# Altium footprint library 6-Connectors-1.PcbLib: 54 footprints (part 3 of 5)
Each footprint in its own frame and in the unit in brackets; x right, y up, seen from the top. Pads: shape width x height; smd on the part's side, far side on the other; paste and mask are expansions set on the pad; w line width, h text height; cw(c..) or ccw(c..) is an arc to the next point about the centre after c.
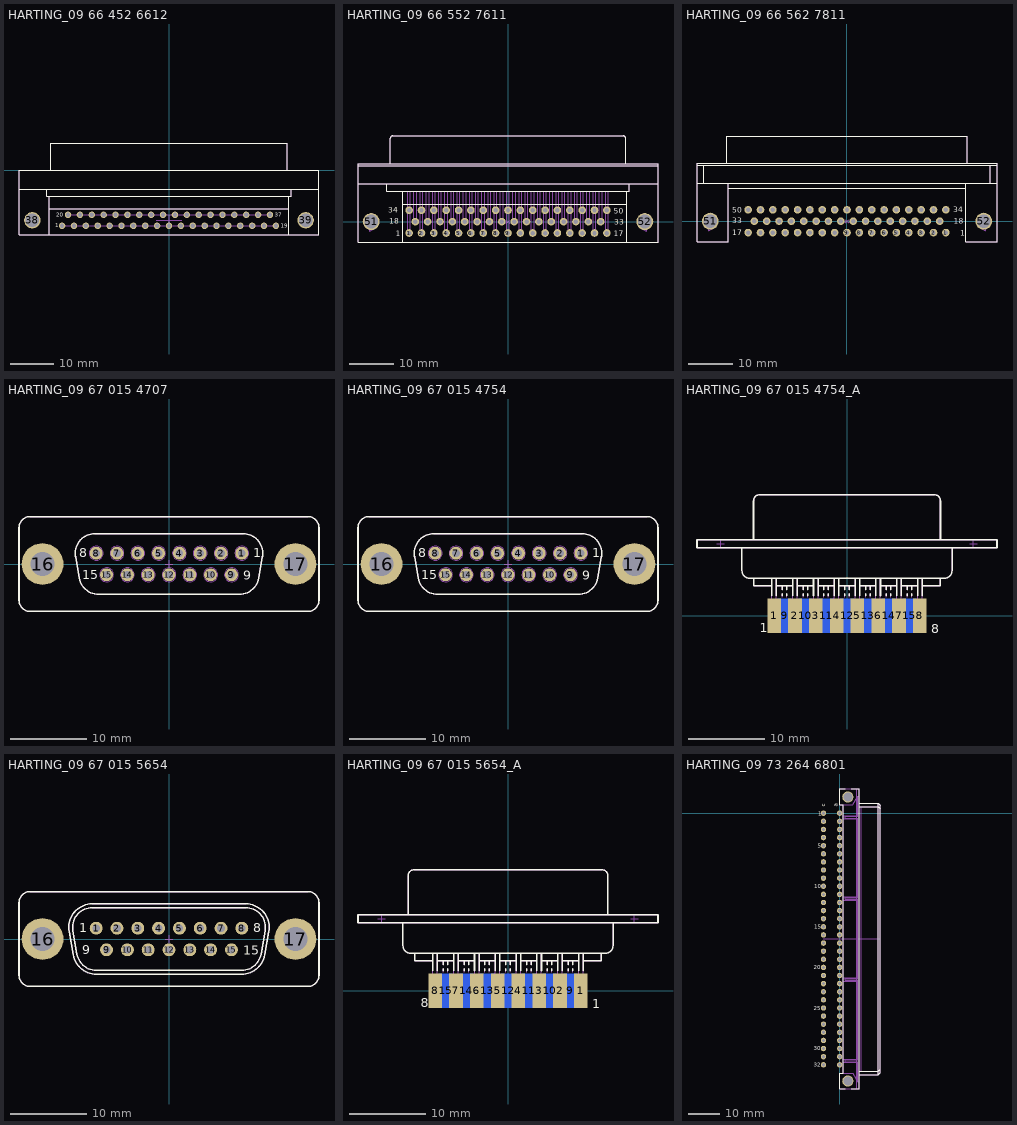
[diagram p2: the footprints below, top view; thin cyan lines are the x and y axes]

## HARTING_09 66 452 6612 [mm] "Right Angled, D-SUB 37 Female Contacts for PCB  With Grounding Board Lock And Female Screwlock UNC 4-40"
height 12.5
pads (39):
  round 1.5 hole 1: 1(-24.84,-12.94) 2(-22.08,-12.94) 3(-19.32,-12.94) 4(-16.56,-12.94) 5(-13.8,-12.94) 6(-11.04,-12.94) 7(-8.28,-12.94) 8(-5.52,-12.94) 9(-2.76,-12.94) 10(0,-12.94) 11(2.76,-12.94) 12(5.52,-12.94) 13(8.28,-12.94) 14(11.04,-12.94) 15(13.8,-12.94) 16(16.56,-12.94) 17(19.32,-12.94) 18(22.08,-12.94) 19(24.84,-12.94) 20(-23.46,-10.4) 21(-20.7,-10.4) 22(-17.94,-10.4) 23(-15.18,-10.4) 24(-12.42,-10.4) 25(-9.66,-10.4) 26(-6.9,-10.4) 27(-4.14,-10.4) 28(-1.38,-10.4) 29(1.38,-10.4) 30(4.14,-10.4) 31(6.9,-10.4) 32(9.66,-10.4) 33(12.42,-10.4) 34(15.18,-10.4) 35(17.94,-10.4) 36(20.7,-10.4) 37(23.46,-10.4)
  round 3.8 hole 3.2: 38(-31.75,-11.67) 39(31.75,-11.67)
Top Overlay:
  lines w0.2: -34.85,-4.5 34.85,-4.5 ; -28.4,-4.5 -28.4,-6.1 28.4,-6.1 28.4,-4.5 ; -27.85,-15 -27.85,-6.1 ; -27.85,-9 27.85,-9 ; -27.436,0 -27.436,6.2 27.436,6.2 27.436,0 ; 27.85,-15 27.85,-6.1 ; -34.85,-15 34.85,-15 ; -34.85,-15 -34.85,0 34.85,0 34.85,-15 ; -34.85,-15 34.85,-15
  text "37" at 24.582,-10.833 h0.97
  text "19" at 25.964,-13.373 h0.97
  text "1" at -26.416,-13.308 h0.97
  text "20" at -26.147,-10.833 h0.97
Mechanical 8:
  lines w0.05: -31.75,-11.7 -30.15,-11.7 ; -24.84,-12.94 24.84,-12.94 ; -23.46,-10.4 23.46,-10.4 ; -3.012,-11.67 0,-11.67 3.012,-11.67 ; 0,-12.94 0,-10.4 ; 31.75,-11.7 33.35,-11.7
Mechanical 14:
  lines w0.1: -34.85,-4.5 34.85,-4.5 ; -28.4,-4.5 -28.4,-6.1 28.4,-6.1 28.4,-4.5 ; -27.85,-15 -27.85,-6.1 ; -27.85,-9 27.85,-9 ; -27.436,0 -27.436,6.2 27.436,6.2 27.436,0 ; 27.85,-15 27.85,-6.1 ; -34.85,-15 34.85,-15 ; -34.85,-15 -34.85,0 34.85,0 34.85,-15 ; -34.85,-15 34.85,-15
  text "37" at 24.582,-10.833 h0.97
  text "19" at 25.964,-13.373 h0.97
  text "1" at -26.416,-13.308 h0.97
  text "20" at -26.147,-10.833 h0.97
3D body "HARTING_09 66 452 6612.stp": height 13.6, standoff -3.2, extent -34.85,-15 34.85,6.2

## HARTING_09 66 552 7611 [mm] "Right Angled D-Sub 50 Female Contacts With Grounding Board Locks And  M3 Nuts Thread"
height 16.4
pads (52):
  round 1.7 hole 1: 1(-22.08,-2.54) 2(-19.32,-2.54) 3(-16.56,-2.54) 4(-13.8,-2.54) 5(-11.04,-2.54) 6(-8.28,-2.54) 7(-5.52,-2.54) 8(-2.76,-2.54) 9(0,-2.54) 10(2.76,-2.54) 11(5.52,-2.54) 12(8.28,-2.54) 13(11.04,-2.54) 14(13.8,-2.54) 15(16.56,-2.54) 16(19.32,-2.54) 17(22.08,-2.54) 18(-20.7,0) 19(-17.94,0) 20(-15.18,0) 21(-12.42,0) 22(-9.66,0) 23(-6.9,0) 24(-4.14,0) 25(-1.38,0) 26(1.38,0) 27(4.14,0) 28(6.9,0) 29(9.66,0) 30(12.42,0) 31(15.18,0) 32(17.94,0) 33(20.7,0) 34(-22.08,2.54) 35(-19.32,2.54) 36(-16.56,2.54) 37(-13.8,2.54) 38(-11.04,2.54) 39(-8.28,2.54) 40(-5.52,2.54) 41(-2.76,2.54) 42(0,2.54) 43(2.76,2.54) 44(5.52,2.54) 45(8.28,2.54) 46(11.04,2.54) 47(13.8,2.54) 48(16.56,2.54) 49(19.32,2.54) 50(22.08,2.54)
  round 3.8 hole 3.1: 51(-30.55,0) 52(30.55,0)
Top Overlay:
  lines w0.2: -33.5,8.44 33.5,8.44 ; -33.5,12.44 33.5,12.44 ; -27.1,8.44 -27.1,6.84 27.1,6.84 27.134,8.44 ; -26.25,12.94 -26.25,18.64 cw(c-25.75,18.64) -25.75,19.14 25.75,19.14 cw(c25.75,18.64) 26.25,18.64 26.25,12.94 ; -23.5,-4.56 -23.5,6.84 ; -23.5,3.94 26.5,3.94 ; 26.5,-4.56 26.5,6.84 ; -33.5,-4.56 -33.5,12.94 33.5,12.94 33.5,-4.56 -33.5,-4.56
  text "17" at 23.656,-3.292 h1.2
  text "18" at -26.541,-0.517 h1.2
  text "34" at -26.694,1.993 h1.2
  text "1" at -25.089,-3.207 h1.2
  text "33" at 23.701,-0.652 h1.2
  text "50" at 23.656,1.788 h1.2
Mechanical 8:
  drawing of 212 lines, arcs and shapes, not listed
Mechanical 14:
  drawing of 165 lines, arcs and shapes, not listed
  text "1" at -25.089,-3.207 h1.2
  text "34" at -26.694,1.993 h1.2
  text "17" at 23.656,-3.292 h1.2
  text "18" at -26.541,-0.517 h1.2
  text "33" at 23.701,-0.652 h1.2
  text "50" at 23.656,1.788 h1.2
3D body "HARTING_09 66 552 7611.stp": height 16.4, standoff -3.2, extent -33.5,-4.56 33.5,19.14

## HARTING_09 66 562 7811 [mm] "Right Angled D-Sub 50 Male Contacts With Grounding Board Locks And  M3 Nuts Thread"
height 16.4
pads (52):
  round 1.7 hole 1: 1(22.08,-2.54) 2(19.32,-2.54) 3(16.56,-2.54) 4(13.8,-2.54) 5(11.04,-2.54) 6(8.28,-2.54) 7(5.52,-2.54) 8(2.76,-2.54) 9(0,-2.54) 10(-2.76,-2.54) 11(-5.52,-2.54) 12(-8.28,-2.54) 13(-11.04,-2.54) 14(-13.8,-2.54) 15(-16.56,-2.54) 16(-19.32,-2.54) 17(-22.08,-2.54) 18(20.7,0) 19(17.94,0) 20(15.18,0) 21(12.42,0) 22(9.66,0) 23(6.9,0) 24(4.14,0) 25(1.38,0) 26(-1.38,0) 27(-4.14,0) 28(-6.9,0) 29(-9.66,0) 30(-12.42,0) 31(-15.18,0) 32(-17.94,0) 33(-20.7,0) 34(22.08,2.54) 35(19.32,2.54) 36(16.56,2.54) 37(13.8,2.54) 38(11.04,2.54) 39(8.28,2.54) 40(5.52,2.54) 41(2.76,2.54) 42(0,2.54) 43(-2.76,2.54) 44(-5.52,2.54) 45(-8.28,2.54) 46(-11.04,2.54) 47(-13.8,2.54) 48(-16.56,2.54) 49(-19.32,2.54) 50(-22.08,2.54)
  round 3.8 hole 3.1: 51(-30.55,0) 52(30.55,0)
Top Overlay:
  lines w0.2: -33.5,8.44 33.5,8.44 ; -33.5,12.44 33.466,12.44 ; -32,8.44 -32,12.44 ; -26.858,12.94 -26.858,18.94 26.858,18.94 26.858,12.94 ; -26.5,7.34 26.5,7.34 ; -26.5,8.44 -26.5,-4.56 -33.5,-4.56 -33.5,12.94 33.5,12.94 33.5,-4.56 26.5,-4.56 26.5,8.44 ; 32,8.44 32,12.44
  text "17" at -25.619,-3.142 h1.2
  text "18" at 23.884,-0.542 h1.2
  text "34" at 23.731,1.968 h1.2
  text "1" at 25.336,-3.232 h1.2
  text "33" at -25.574,-0.502 h1.2
  text "50" at -25.619,1.938 h1.2
Mechanical 8:
  drawing of 212 lines, arcs and shapes, not listed
Mechanical 14:
  lines w0.1: -33.5,8.44 33.5,8.44 ; -33.5,12.44 33.466,12.44 ; -32,8.44 -32,12.44 ; -31.528,1.036 -31.115,0.322 -29.809,1.076 -30.221,1.791 -31.502,1.051 ; -26.858,12.94 -26.858,18.94 26.858,18.94 26.858,12.94 ; -26.5,7.34 26.5,7.34 ; -26.5,8.44 -26.5,-4.56 -33.5,-4.56 -33.5,12.94 33.5,12.94 33.5,-4.56 26.5,-4.56 26.5,8.44 ; 32,8.44 32,12.44 ; -31.291,-1.396 -30.01,-0.657 -29.572,-1.356 -30.879,-2.111 -31.291,-1.396 ; 29.572,-1.356 30.879,-2.111 31.291,-1.396 29.985,-0.642 29.572,-1.356 ; 29.809,1.076 31.115,0.322 31.528,1.036 30.221,1.791 29.809,1.076
  text "1" at 25.336,-3.232 h1.2
  text "34" at 23.731,1.968 h1.2
  text "17" at -25.619,-3.142 h1.2
  text "18" at 23.884,-0.542 h1.2
  text "33" at -25.574,-0.502 h1.2
  text "50" at -25.619,1.938 h1.2
3D body "HARTING_09 66 562 7811.stp": height 16.4, standoff -3.2, extent -33.5,-4.56 33.5,18.94
3D body "v160-080.stp": height 0.02, standoff -1.65, extent -22.88,1.74 -21.28,3.34
3D body "v160-080.stp": height 0.02, standoff -1.65, extent -21.5,-0.8 -19.9,0.8
3D body "v160-080.stp": height 0.02, standoff -1.65, extent -22.88,-3.34 -21.28,-1.74
3D body "v160-080.stp": height 0.02, standoff -1.65, extent -20.12,-3.34 -18.52,-1.74
3D body "v160-080.stp": height 0.02, standoff -1.65, extent -18.74,-0.8 -17.14,0.8
3D body "v160-080.stp": height 0.02, standoff -1.65, extent -20.12,1.74 -18.52,3.34
3D body "v160-080.stp": height 0.02, standoff -1.65, extent -17.36,1.74 -15.76,3.34
3D body "v160-080.stp": height 0.02, standoff -1.65, extent -15.98,-0.8 -14.38,0.8
3D body "v160-080.stp": height 0.02, standoff -1.65, extent -17.36,-3.34 -15.76,-1.74
3D body "v160-080.stp": height 0.02, standoff -1.65, extent -14.6,-3.34 -13,-1.74
3D body "v160-080.stp": height 0.02, standoff -1.65, extent -13.22,-0.8 -11.62,0.8
3D body "v160-080.stp": height 0.02, standoff -1.65, extent -14.6,1.74 -13,3.34
3D body "v160-080.stp": height 0.02, standoff -1.65, extent -11.84,-3.34 -10.24,-1.74
3D body "v160-080.stp": height 0.02, standoff -1.65, extent -10.46,-0.8 -8.86,0.8
3D body "v160-080.stp": height 0.02, standoff -1.65, extent -11.84,1.74 -10.24,3.34
3D body "v160-080.stp": height 0.02, standoff -1.65, extent -9.08,1.74 -7.48,3.34
3D body "v160-080.stp": height 0.02, standoff -1.65, extent -7.7,-0.8 -6.1,0.8
3D body "v160-080.stp": height 0.02, standoff -1.65, extent -9.08,-3.34 -7.48,-1.74
3D body "v160-080.stp": height 0.02, standoff -1.65, extent -6.32,-3.34 -4.72,-1.74
3D body "v160-080.stp": height 0.02, standoff -1.65, extent -4.94,-0.8 -3.34,0.8
3D body "v160-080.stp": height 0.02, standoff -1.65, extent -6.32,1.74 -4.72,3.34
3D body "v160-080.stp": height 0.02, standoff -1.65, extent -3.56,-3.34 -1.96,-1.74
3D body "v160-080.stp": height 0.02, standoff -1.65, extent -2.18,-0.8 -0.58,0.8
3D body "v160-080.stp": height 0.02, standoff -1.65, extent -3.56,1.74 -1.96,3.34
3D body "v160-080.stp": height 0.02, standoff -1.65, extent -0.8,-3.34 0.8,-1.74
3D body "v160-080.stp": height 0.02, standoff -1.65, extent 0.58,-0.8 2.18,0.8
3D body "v160-080.stp": height 0.02, standoff -1.65, extent -0.8,1.74 0.8,3.34
3D body "v160-080.stp": height 0.02, standoff -1.65, extent 1.96,1.74 3.56,3.34
3D body "v160-080.stp": height 0.02, standoff -1.65, extent 3.34,-0.8 4.94,0.8
3D body "v160-080.stp": height 0.02, standoff -1.65, extent 1.96,-3.34 3.56,-1.74
3D body "v160-080.stp": height 0.02, standoff -1.65, extent 4.72,-3.34 6.32,-1.74
3D body "v160-080.stp": height 0.02, standoff -1.65, extent 6.1,-0.8 7.7,0.8
3D body "v160-080.stp": height 0.02, standoff -1.65, extent 4.72,1.74 6.32,3.34
3D body "v160-080.stp": height 0.02, standoff -1.65, extent 7.48,1.74 9.08,3.34
3D body "v160-080.stp": height 0.02, standoff -1.65, extent 8.86,-0.8 10.46,0.8
3D body "v160-080.stp": height 0.02, standoff -1.65, extent 7.48,-3.34 9.08,-1.74
3D body "v160-080.stp": height 0.02, standoff -1.65, extent 10.24,-3.34 11.84,-1.74
3D body "v160-080.stp": height 0.02, standoff -1.65, extent 11.62,-0.8 13.22,0.8
3D body "v160-080.stp": height 0.02, standoff -1.65, extent 10.24,1.74 11.84,3.34
3D body "v160-080.stp": height 0.02, standoff -1.65, extent 13,1.74 14.6,3.34
3D body "v160-080.stp": height 0.02, standoff -1.65, extent 14.38,-0.8 15.98,0.8
3D body "v160-080.stp": height 0.02, standoff -1.65, extent 13,-3.34 14.6,-1.74
3D body "v160-080.stp": height 0.02, standoff -1.65, extent 15.76,-3.34 17.36,-1.74
3D body "v160-080.stp": height 0.02, standoff -1.65, extent 18.52,-3.34 20.12,-1.74
3D body "v160-080.stp": height 0.02, standoff -1.65, extent 21.28,-3.34 22.88,-1.74
3D body "v160-080.stp": height 0.02, standoff -1.65, extent 19.9,-0.8 21.5,0.8
3D body "v160-080.stp": height 0.02, standoff -1.65, extent 17.14,-0.8 18.74,0.8
3D body "v160-080.stp": height 0.02, standoff -1.65, extent 15.76,1.74 17.36,3.34
3D body "v160-080.stp": height 0.02, standoff -1.65, extent 18.52,1.74 20.12,3.34
3D body "v160-080.stp": height 0.02, standoff -1.65, extent 21.28,1.74 22.88,3.34

## HARTING_09 67 015 4707 [mm] "D-Sub, Female, 15 Poles, Wrap Posts"
height 12
pads (17):
  round 1.7 hole 1: 1(9.59,1.42) 2(6.85,1.42) 3(4.11,1.42) 4(1.37,1.42) 5(-1.37,1.42) 6(-4.11,1.42) 7(-6.85,1.42) 8(-9.59,1.42) 9(8.22,-1.42) 10(5.48,-1.42) 11(2.74,-1.42) 12(0,-1.42) 13(-2.74,-1.42) 14(-5.48,-1.42) 15(-8.22,-1.42)
  round 5.5 hole 3.2: 16(-16.65,0) 17(16.65,0)
Top Overlay:
  lines w0.2: -19.75,-4.75 ccw(c-18.25,-4.75) -18.25,-6.25 18.25,-6.25 ccw(c18.25,-4.75) 19.75,-4.75 19.75,4.75 ccw(c18.25,4.75) 18.25,6.25 -18.25,6.25 ccw(c-18.25,4.75) -19.75,4.75 -19.75,-4.75 ; -12.311,0.949 cw(c-9.75,1.4) -9.75,4 9.75,4 cw(c9.75,1.4) 12.311,0.949 11.817,-1.851 cw(c9.256,-1.4) 9.256,-4 -9.256,-4 cw(c-9.256,-1.4) -11.817,-1.851 -12.311,0.949
  text "15" at -11.4,-2 h1.2
  text "8" at -11.8,0.9 h1.2
  text "1" at 11.085,0.873 h1.2
  text "9" at 9.8,-2.1 h1.2
Mechanical 8:
  lines w0.1: -17.15,0 -16.65,0 ; -16.65,-0.5 -16.65,0 ; -16.65,0.5 -16.65,0 ; -16.15,0 -16.65,0 ; -10.09,1.42 -9.59,1.42 ; -9.59,0.92 -9.59,1.42 ; -9.59,1.92 -9.59,1.42 ; -9.09,1.42 -9.59,1.42 ; -8.72,-1.42 -8.22,-1.42 ; -8.22,-1.92 -8.22,-1.42 ; -8.22,-0.92 -8.22,-1.42 ; -7.72,-1.42 -8.22,-1.42 ; -7.35,1.42 -6.85,1.42 ; -6.85,0.92 -6.85,1.42 ; -6.85,1.92 -6.85,1.42 ; -6.35,1.42 -6.85,1.42 ; -5.98,-1.42 -5.48,-1.42 ; -5.48,-1.92 -5.48,-1.42 ; -5.48,-0.92 -5.48,-1.42 ; -4.98,-1.42 -5.48,-1.42 ; -4.61,1.42 -4.11,1.42 ; -4.11,0.92 -4.11,1.42 ; -4.11,1.92 -4.11,1.42 ; -3.61,1.42 -4.11,1.42 ; -3.24,-1.42 -2.74,-1.42 ; -2.74,-1.92 -2.74,-1.42 ; -2.74,-0.92 -2.74,-1.42 ; -2.24,-1.42 -2.74,-1.42 ; -1.87,1.42 -1.37,1.42 ; -1.37,0.92 -1.37,1.42 ; -1.37,1.92 -1.37,1.42 ; -0.87,1.42 -1.37,1.42 ; -0.5,-1.42 0,-1.42 ; -0.5,0 0,0 ; 0,-1.92 0,-1.42 ; 0,-0.92 0,-1.42 ; 0,-0.5 0,0 ; 0,0.5 0,0 ; 0.5,-1.42 0,-1.42 ; 0.5,0 0,0 ; 0.87,1.42 1.37,1.42 ; 1.37,0.92 1.37,1.42 ; 1.37,1.92 1.37,1.42 ; 1.87,1.42 1.37,1.42 ; 2.24,-1.42 2.74,-1.42 ; 2.74,-1.92 2.74,-1.42 ; 2.74,-0.92 2.74,-1.42 ; 3.24,-1.42 2.74,-1.42 ; 3.61,1.42 4.11,1.42 ; 4.11,0.92 4.11,1.42 ; 4.11,1.92 4.11,1.42 ; 4.61,1.42 4.11,1.42 ; 4.98,-1.42 5.48,-1.42 ; 5.48,-1.92 5.48,-1.42 ; 5.48,-0.92 5.48,-1.42 ; 5.98,-1.42 5.48,-1.42 ; 6.35,1.42 6.85,1.42 ; 6.85,0.92 6.85,1.42 ; 6.85,1.92 6.85,1.42 ; 7.35,1.42 6.85,1.42 ; 7.72,-1.42 8.22,-1.42 ; 8.22,-1.92 8.22,-1.42 ; 8.22,-0.92 8.22,-1.42 ; 8.72,-1.42 8.22,-1.42 ; 9.09,1.42 9.59,1.42 ; 9.59,0.92 9.59,1.42 ; 9.59,1.92 9.59,1.42 ; 10.09,1.42 9.59,1.42 ; 16.15,0 16.65,0 ; 16.65,-0.5 16.65,0 ; 16.65,0.5 16.65,0 ; 17.15,0 16.65,0
Mechanical 14:
  circle w0.1: c-8.22,-1.42 r0.55
  circle w0.1: c-5.48,-1.42 r0.55
  circle w0.1: c-2.74,-1.42 r0.55
  circle w0.1: c0,-1.42 r0.55
  circle w0.1: c2.74,-1.42 r0.55
  circle w0.1: c5.48,-1.42 r0.55
  circle w0.1: c8.22,-1.42 r0.55
  circle w0.1: c9.59,1.42 r0.55
  circle w0.1: c6.85,1.42 r0.55
  circle w0.1: c4.11,1.42 r0.55
  circle w0.1: c1.37,1.42 r0.55
  circle w0.1: c-1.37,1.42 r0.55
  circle w0.1: c-4.11,1.42 r0.55
  circle w0.1: c-6.85,1.42 r0.55
  circle w0.1: c-9.59,1.42 r0.55
  circle w0.1: c16.65,0 r1.55
  circle w0.1: c-16.65,0 r1.55
  circle w0.1: c-8.22,-1.42 r0.92
  circle w0.1: c-5.48,-1.42 r0.92
  circle w0.1: c-2.74,-1.42 r0.92
  circle w0.1: c0,-1.42 r0.92
  circle w0.1: c2.74,-1.42 r0.92
  circle w0.1: c5.48,-1.42 r0.92
  circle w0.1: c8.22,-1.42 r0.92
  circle w0.1: c9.59,1.42 r0.92
  circle w0.1: c6.85,1.42 r0.92
  circle w0.1: c4.11,1.42 r0.92
  circle w0.1: c1.37,1.42 r0.92
  circle w0.1: c-1.37,1.42 r0.92
  circle w0.1: c-4.11,1.42 r0.92
  circle w0.1: c-6.85,1.42 r0.92
  circle w0.1: c-9.59,1.42 r0.92
  lines w0.1: -19.75,-4.75 ccw(c-18.25,-4.75) -18.25,-6.25 18.25,-6.25 ccw(c18.25,-4.75) 19.75,-4.75 19.75,4.75 ccw(c18.25,4.75) 18.25,6.25 -18.25,6.25 ccw(c-18.25,4.75) -19.75,4.75 -19.75,-4.75 ; -12.311,0.949 cw(c-9.75,1.4) -9.75,4 9.75,4 cw(c9.75,1.4) 12.311,0.949 11.817,-1.851 cw(c9.256,-1.4) 9.256,-4 -9.256,-4 cw(c-9.256,-1.4) -11.817,-1.851 -12.311,0.949
  text "9" at 9.8,-2.1 h1.2
  text "1" at 11.085,0.873 h1.2
  text "8" at -11.8,0.9 h1.2
  text "15" at -11.4,-2 h1.2
3D body "HARTING_09 67 015 4707.stp": height 12, standoff -13, extent -19.75,-6.25 19.75,6.25

## HARTING_09 67 015 4754 [mm] "Straight D-SUB 15 Female Contacts"
height 12
pads (17):
  round 1.7 hole 1: 1(9.59,1.42) 2(6.85,1.42) 3(4.11,1.42) 4(1.37,1.42) 5(-1.37,1.42) 6(-4.11,1.42) 7(-6.85,1.42) 8(-9.59,1.42) 9(8.22,-1.42) 10(5.48,-1.42) 11(2.74,-1.42) 12(0,-1.42) 13(-2.74,-1.42) 14(-5.48,-1.42) 15(-8.22,-1.42)
  round 5.5 hole 3.2: 16(-16.65,0) 17(16.65,0)
Top Overlay:
  lines w0.2: -19.75,-4.75 ccw(c-18.25,-4.75) -18.25,-6.25 18.25,-6.25 ccw(c18.25,-4.75) 19.75,-4.75 19.75,4.75 ccw(c18.25,4.75) 18.25,6.25 -18.25,6.25 ccw(c-18.25,4.75) -19.75,4.75 -19.75,-4.75 ; -12.311,0.949 cw(c-9.75,1.4) -9.75,4 9.75,4 cw(c9.75,1.4) 12.311,0.949 11.817,-1.851 cw(c9.256,-1.4) 9.256,-4 -9.256,-4 cw(c-9.256,-1.4) -11.817,-1.851 -12.311,0.949
  text "9" at 9.8,-2.1 h1.2
  text "1" at 11.085,0.873 h1.2
  text "8" at -11.8,0.9 h1.2
  text "15" at -11.4,-2 h1.2
Mechanical 8:
  lines w0.1: -17.15,0 -16.65,0 ; -16.65,-0.5 -16.65,0 ; -16.65,0.5 -16.65,0 ; -16.15,0 -16.65,0 ; -10.09,1.42 -9.59,1.42 ; -9.59,0.92 -9.59,1.42 ; -9.59,1.92 -9.59,1.42 ; -9.09,1.42 -9.59,1.42 ; -8.72,-1.42 -8.22,-1.42 ; -8.22,-1.92 -8.22,-1.42 ; -8.22,-0.92 -8.22,-1.42 ; -7.72,-1.42 -8.22,-1.42 ; -7.35,1.42 -6.85,1.42 ; -6.85,0.92 -6.85,1.42 ; -6.85,1.92 -6.85,1.42 ; -6.35,1.42 -6.85,1.42 ; -5.98,-1.42 -5.48,-1.42 ; -5.48,-1.92 -5.48,-1.42 ; -5.48,-0.92 -5.48,-1.42 ; -4.98,-1.42 -5.48,-1.42 ; -4.61,1.42 -4.11,1.42 ; -4.11,0.92 -4.11,1.42 ; -4.11,1.92 -4.11,1.42 ; -3.61,1.42 -4.11,1.42 ; -3.24,-1.42 -2.74,-1.42 ; -2.74,-1.92 -2.74,-1.42 ; -2.74,-0.92 -2.74,-1.42 ; -2.24,-1.42 -2.74,-1.42 ; -1.87,1.42 -1.37,1.42 ; -1.37,0.92 -1.37,1.42 ; -1.37,1.92 -1.37,1.42 ; -0.87,1.42 -1.37,1.42 ; -0.5,-1.42 0,-1.42 ; -0.5,0 0,0 ; 0,-1.92 0,-1.42 ; 0,-0.92 0,-1.42 ; 0,-0.5 0,0 ; 0,0.5 0,0 ; 0.5,-1.42 0,-1.42 ; 0.5,0 0,0 ; 0.87,1.42 1.37,1.42 ; 1.37,0.92 1.37,1.42 ; 1.37,1.92 1.37,1.42 ; 1.87,1.42 1.37,1.42 ; 2.24,-1.42 2.74,-1.42 ; 2.74,-1.92 2.74,-1.42 ; 2.74,-0.92 2.74,-1.42 ; 3.24,-1.42 2.74,-1.42 ; 3.61,1.42 4.11,1.42 ; 4.11,0.92 4.11,1.42 ; 4.11,1.92 4.11,1.42 ; 4.61,1.42 4.11,1.42 ; 4.98,-1.42 5.48,-1.42 ; 5.48,-1.92 5.48,-1.42 ; 5.48,-0.92 5.48,-1.42 ; 5.98,-1.42 5.48,-1.42 ; 6.35,1.42 6.85,1.42 ; 6.85,0.92 6.85,1.42 ; 6.85,1.92 6.85,1.42 ; 7.35,1.42 6.85,1.42 ; 7.72,-1.42 8.22,-1.42 ; 8.22,-1.92 8.22,-1.42 ; 8.22,-0.92 8.22,-1.42 ; 8.72,-1.42 8.22,-1.42 ; 9.09,1.42 9.59,1.42 ; 9.59,0.92 9.59,1.42 ; 9.59,1.92 9.59,1.42 ; 10.09,1.42 9.59,1.42 ; 16.15,0 16.65,0 ; 16.65,-0.5 16.65,0 ; 16.65,0.5 16.65,0 ; 17.15,0 16.65,0
Mechanical 14:
  circle w0.1: c-9.59,1.42 r0.92
  circle w0.1: c-6.85,1.42 r0.92
  circle w0.1: c-4.11,1.42 r0.92
  circle w0.1: c-1.37,1.42 r0.92
  circle w0.1: c1.37,1.42 r0.92
  circle w0.1: c4.11,1.42 r0.92
  circle w0.1: c6.85,1.42 r0.92
  circle w0.1: c9.59,1.42 r0.92
  circle w0.1: c8.22,-1.42 r0.92
  circle w0.1: c5.48,-1.42 r0.92
  circle w0.1: c2.74,-1.42 r0.92
  circle w0.1: c0,-1.42 r0.92
  circle w0.1: c-2.74,-1.42 r0.92
  circle w0.1: c-5.48,-1.42 r0.92
  circle w0.1: c-8.22,-1.42 r0.92
  circle w0.1: c-16.65,0 r1.55
  circle w0.1: c16.65,0 r1.55
  circle w0.1: c-9.59,1.42 r0.55
  circle w0.1: c-6.85,1.42 r0.55
  circle w0.1: c-4.11,1.42 r0.55
  circle w0.1: c-1.37,1.42 r0.55
  circle w0.1: c1.37,1.42 r0.55
  circle w0.1: c4.11,1.42 r0.55
  circle w0.1: c6.85,1.42 r0.55
  circle w0.1: c9.59,1.42 r0.55
  circle w0.1: c8.22,-1.42 r0.55
  circle w0.1: c5.48,-1.42 r0.55
  circle w0.1: c2.74,-1.42 r0.55
  circle w0.1: c0,-1.42 r0.55
  circle w0.1: c-2.74,-1.42 r0.55
  circle w0.1: c-5.48,-1.42 r0.55
  circle w0.1: c-8.22,-1.42 r0.55
  lines w0.1: -19.75,-4.75 ccw(c-18.25,-4.75) -18.25,-6.25 18.25,-6.25 ccw(c18.25,-4.75) 19.75,-4.75 19.75,4.75 ccw(c18.25,4.75) 18.25,6.25 -18.25,6.25 ccw(c-18.25,4.75) -19.75,4.75 -19.75,-4.75 ; -12.311,0.949 cw(c-9.75,1.4) -9.75,4 9.75,4 cw(c9.75,1.4) 12.311,0.949 11.817,-1.851 cw(c9.256,-1.4) 9.256,-4 -9.256,-4 cw(c-9.256,-1.4) -11.817,-1.851 -12.311,0.949
  text "15" at -11.4,-2 h1.2
  text "8" at -11.8,0.9 h1.2
  text "1" at 11.085,0.873 h1.2
  text "9" at 9.8,-2.1 h1.2
3D body "HARTING_09 67 015 4754.stp": height 12, standoff -6, extent -19.75,-6.25 19.75,6.25
